# Altium footprint library Capacitance.PcbLib: 176 footprints (part 9 of 11)
Each footprint in its own frame and in the unit in brackets; x right, y up, seen from the top. Pads: shape width x height; smd on the part's side, far side on the other; paste and mask are expansions set on the pad; w line width, h text height; cw(c..) or ccw(c..) is an arc to the next point about the centre after c.
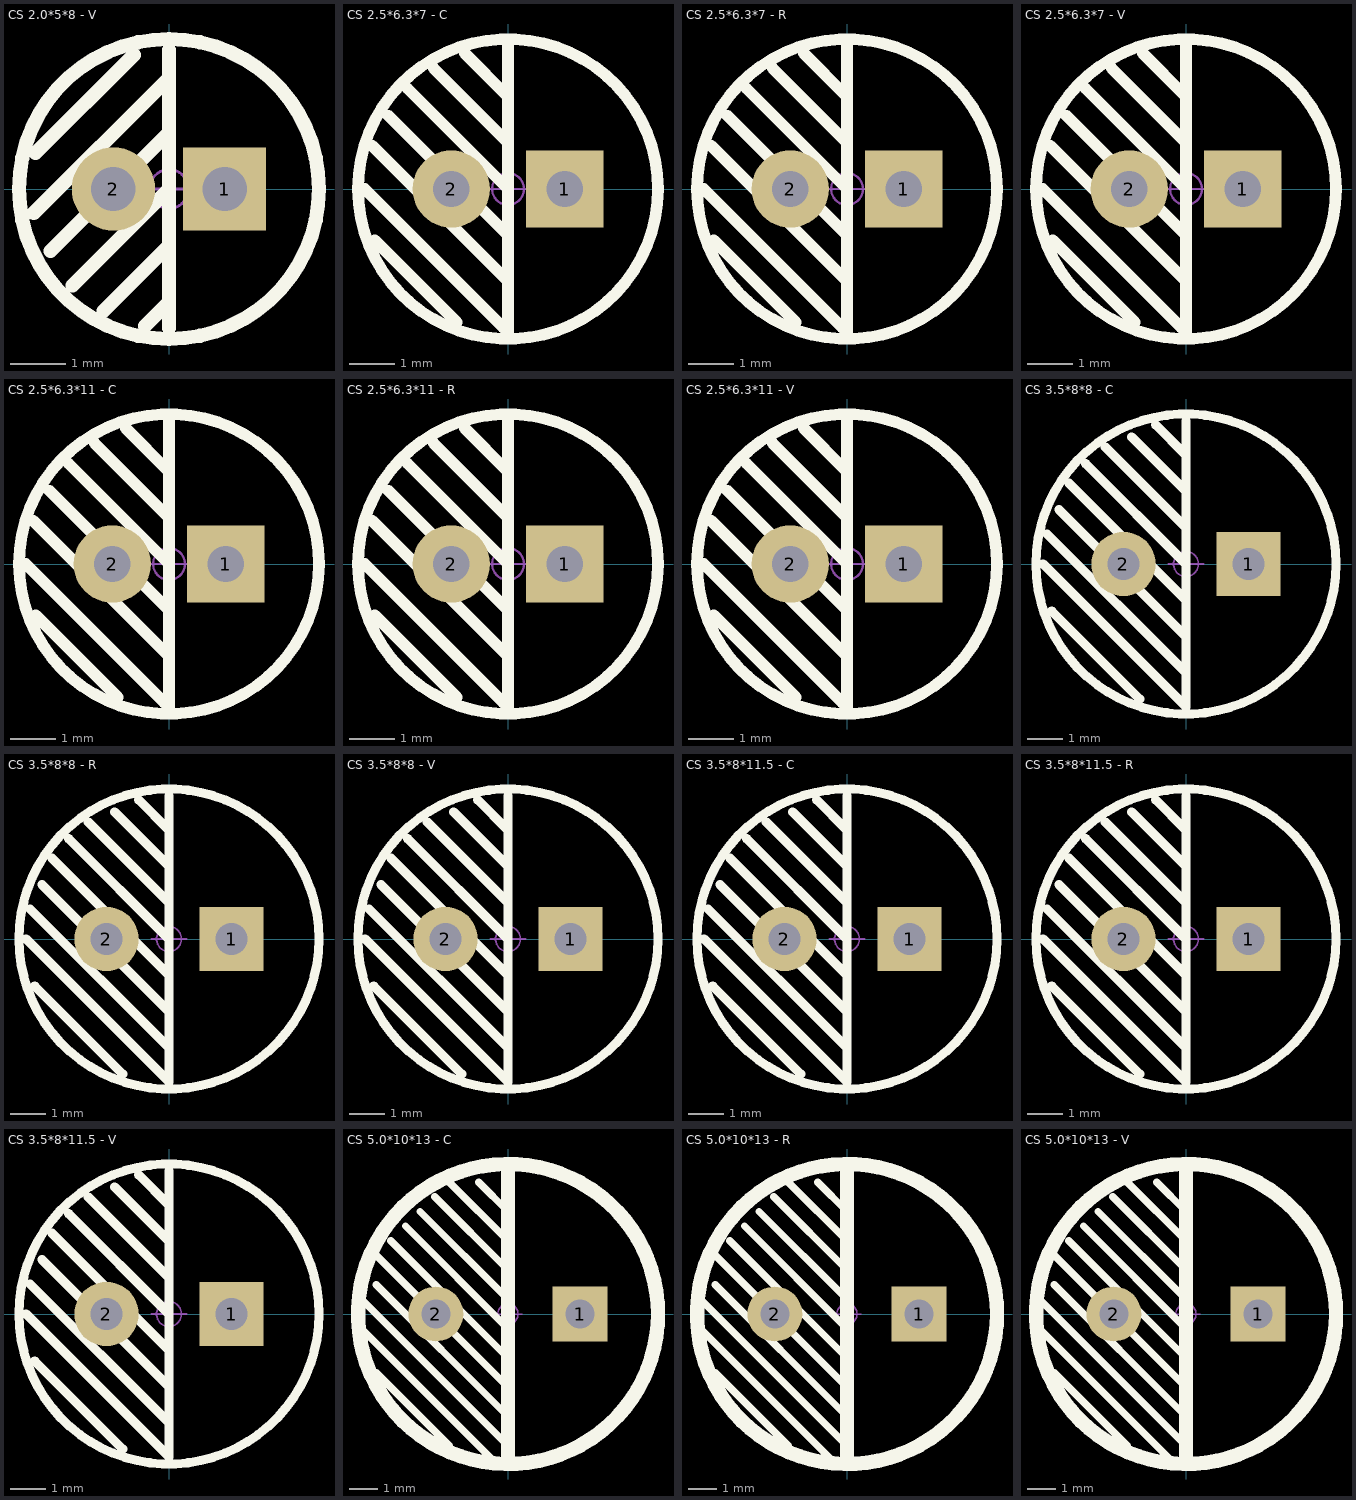
[diagram p8: the footprints below, top view; thin cyan lines are the x and y axes]

## CS 2.0*5*8 - V [mm] "ï¿½Å¾ï¿½2mm , Ö±ï¿½ï¿½5mm , ï¿½ï¿½8mm"
pads (2):
  rect 1.5x1.5 hole 0.8: 1(1,0)
  round 1.5 hole 0.8: 2(-1,0)
Top Overlay:
  circle w0.254: c0,0 r2.7
  lines w0.254: -2.435,-0.435 0,2 ; -2.4,0.648 -0.635,2.413 ; -2.134,-1.118 0,1.016 ; -1.74,-1.74 0,0 ; -1.181,-2.197 0,-1.016 ; -0.432,-2.464 0,-2.032 ; 0,-2.5 0,2 ; 0,2.5 0,2
Mechanical 15:
  circle w0.05: c0,0 r0.35
  lines w0.05: -0.5,0 0.5,0 ; 0,-0.5 0,0.5
3D body "CS 5X8.STEP": height 8.02, standoff -3.48, extent -2.5,-2.5 2.5,2.5

## CS 2.5*6.3*7 - C [mm] "ï¿½Å¾ï¿½2.5mm , Ö±ï¿½ï¿½6.3mm , ï¿½ï¿½7mm"
pads (2):
  rect 1.7x1.7 hole 0.8: 1(1.25,0)
  round 1.7 hole 0.8: 2(-1.25,0)
Top Overlay:
  circle w0.254: c0,0 r3.3
  lines w0.254: -3.15,0 -0.102,-3.048 0,-3.048 ; -2.984,0.953 0,-2.032 ; -2.934,-1.13 -1.13,-2.934 ; -2.629,1.613 0,-1.016 ; -2.21,2.21 0,0 ; -1.638,2.654 0,1.016 ; -0.953,2.984 0,2.032 ; 0,-3.15 0,3.15
Mechanical 15:
  circle w0.05: c0,0 r0.35
  lines w0.05: -0.5,0 0.5,0 ; 0,-0.5 0,0.5
3D body "CS 6.3X7.STEP": height 7.02, standoff -3.48, extent -3.15,-3.15 3.15,3.15

## CS 2.5*6.3*7 - R [mm] "ï¿½Å¾ï¿½2.5mm , Ö±ï¿½ï¿½6.3mm , ï¿½ï¿½7mm"
pads (2):
  rect 1.7x1.7 hole 0.8: 1(1.25,0)
  round 1.7 hole 0.8: 2(-1.25,0)
Top Overlay:
  circle w0.254: c0,0 r3.3
  lines w0.254: -3.15,0 -0.102,-3.048 0,-3.048 ; -2.984,0.953 0,-2.032 ; -2.934,-1.13 -1.13,-2.934 ; -2.629,1.613 0,-1.016 ; -2.21,2.21 0,0 ; -1.638,2.654 0,1.016 ; -0.953,2.984 0,2.032 ; 0,-3.15 0,3.15
Mechanical 15:
  circle w0.05: c0,0 r0.35
  lines w0.05: -0.5,0 0.5,0 ; 0,-0.5 0,0.5
3D body "CS 6.3X7.STEP": height 7.02, standoff -3.48, extent -3.15,-3.15 3.15,3.15

## CS 2.5*6.3*7 - V [mm] "ï¿½Å¾ï¿½2.5mm , Ö±ï¿½ï¿½6.3mm , ï¿½ï¿½7mm"
pads (2):
  rect 1.7x1.7 hole 0.8: 1(1.25,0)
  round 1.7 hole 0.8: 2(-1.25,0)
Top Overlay:
  circle w0.254: c0,0 r3.3
  lines w0.254: -3.15,0 -0.102,-3.048 0,-3.048 ; -2.984,0.953 0,-2.032 ; -2.934,-1.13 -1.13,-2.934 ; -2.629,1.613 0,-1.016 ; -2.21,2.21 0,0 ; -1.638,2.654 0,1.016 ; -0.953,2.984 0,2.032 ; 0,-3.15 0,3.15
Mechanical 15:
  circle w0.05: c0,0 r0.35
  lines w0.05: -0.5,0 0.5,0 ; 0,-0.5 0,0.5
3D body "CS 6.3X7.STEP": height 7, standoff -3.5, extent -3.15,-3.15 3.15,3.15

## CS 2.5*6.3*11 - C [mm] "ï¿½Å¾ï¿½2.5mm , Ö±ï¿½ï¿½6.3mm , ï¿½ï¿½11mm"
pads (2):
  rect 1.7x1.7 hole 0.8: 1(1.25,0)
  round 1.7 hole 0.8: 2(-1.25,0)
Top Overlay:
  circle w0.254: c0,0 r3.3
  lines w0.254: -3.15,0 -0.102,-3.048 0,-3.048 ; -2.984,0.953 0,-2.032 ; -2.934,-1.13 -1.13,-2.934 ; -2.629,1.613 0,-1.016 ; -2.21,2.21 0,0 ; -1.638,2.654 0,1.016 ; -0.953,2.984 0,2.032 ; 0,-3.15 0,3.15
Mechanical 15:
  circle w0.05: c0,0 r0.35
  lines w0.05: -0.5,0 0.5,0 ; 0,-0.5 0,0.5
3D body "CS 6.3X11.STEP": height 11.02, standoff -3.48, extent -3.15,-3.15 3.15,3.15

## CS 2.5*6.3*11 - R [mm] "ï¿½Å¾ï¿½2.5mm , Ö±ï¿½ï¿½6.3mm , ï¿½ï¿½11mm"
pads (2):
  rect 1.7x1.7 hole 0.8: 1(1.25,0)
  round 1.7 hole 0.8: 2(-1.25,0)
Top Overlay:
  circle w0.254: c0,0 r3.3
  lines w0.254: -3.15,0 -0.102,-3.048 0,-3.048 ; -2.984,0.953 0,-2.032 ; -2.934,-1.13 -1.13,-2.934 ; -2.629,1.613 0,-1.016 ; -2.21,2.21 0,0 ; -1.638,2.654 0,1.016 ; -0.953,2.984 0,2.032 ; 0,-3.15 0,3.15
Mechanical 15:
  circle w0.05: c0,0 r0.35
  lines w0.05: -0.5,0 0.5,0 ; 0,-0.5 0,0.5
3D body "CS 6.3X11.STEP": height 11.02, standoff -3.48, extent -3.15,-3.15 3.15,3.15

## CS 2.5*6.3*11 - V [mm] "ï¿½Å¾ï¿½2.5mm , Ö±ï¿½ï¿½6.3mm , ï¿½ï¿½11mm"
pads (2):
  rect 1.7x1.7 hole 0.8: 1(1.25,0)
  round 1.7 hole 0.8: 2(-1.25,0)
Top Overlay:
  circle w0.254: c0,0 r3.3
  lines w0.254: -3.15,0 -0.102,-3.048 0,-3.048 ; -2.984,0.953 0,-2.032 ; -2.934,-1.13 -1.13,-2.934 ; -2.629,1.613 0,-1.016 ; -2.21,2.21 0,0 ; -1.638,2.654 0,1.016 ; -0.953,2.984 0,2.032 ; 0,-3.15 0,3.15
Mechanical 15:
  circle w0.05: c0,0 r0.35
  lines w0.05: -0.5,0 0.5,0 ; 0,-0.5 0,0.5
3D body "CS 6.3X11.STEP": height 11.02, standoff -3.48, extent -3.15,-3.15 3.15,3.15

## CS 3.5*8*8 - C [mm] "ï¿½Å¾ï¿½3.5mm , Ö±ï¿½ï¿½8mm , ï¿½ï¿½8mm"
pads (2):
  rect 1.8x1.8 hole 0.9: 1(1.75,0)
  round 1.8 hole 0.9: 2(-1.75,0)
Top Overlay:
  circle w0.254: c0,0 r4.2
  lines w0.254: -4,0 0,-4 0,4 ; -3.886,0.838 0,-3.048 ; -3.759,-1.321 -1.295,-3.785 ; -3.556,1.524 0,-2.032 ; -3.277,2.261 0,-1.016 ; -2.807,2.807 0,0 ; -2.261,3.277 0,1.016 ; -1.524,3.556 0,2.032 ; -0.851,3.899 0,3.048
Mechanical 15:
  circle w0.05: c0,0 r0.35
  lines w0.05: -0.5,0 0.5,0 ; 0,-0.5 0,0.5
3D body "CS 8X8.STEP": height 8.02, standoff -3.48, extent -4,-4 4,4

## CS 3.5*8*8 - R [mm] "ï¿½Å¾ï¿½3.5mm , Ö±ï¿½ï¿½8mm , ï¿½ï¿½8mm"
pads (2):
  rect 1.8x1.8 hole 0.9: 1(1.75,0)
  round 1.8 hole 0.9: 2(-1.75,0)
Top Overlay:
  circle w0.254: c0,0 r4.2
  lines w0.254: -4,0 0,-4 0,4 ; -3.886,0.838 0,-3.048 ; -3.759,-1.321 -1.295,-3.785 ; -3.556,1.524 0,-2.032 ; -3.277,2.261 0,-1.016 ; -2.807,2.807 0,0 ; -2.261,3.277 0,1.016 ; -1.524,3.556 0,2.032 ; -0.851,3.899 0,3.048
Mechanical 15:
  circle w0.05: c0,0 r0.35
  lines w0.05: -0.5,0 0.5,0 ; 0,-0.5 0,0.5
3D body "CS 8X8.STEP": height 8.02, standoff -3.48, extent -4,-4 4,4

## CS 3.5*8*8 - V [mm] "ï¿½Å¾ï¿½3.5mm , Ö±ï¿½ï¿½8mm , ï¿½ï¿½8mm"
pads (2):
  rect 1.8x1.8 hole 0.9: 1(1.75,0)
  round 1.8 hole 0.9: 2(-1.75,0)
Top Overlay:
  circle w0.254: c0,0 r4.2
  lines w0.254: -4,0 0,-4 0,4 ; -3.886,0.838 0,-3.048 ; -3.759,-1.321 -1.295,-3.785 ; -3.556,1.524 0,-2.032 ; -3.277,2.261 0,-1.016 ; -2.807,2.807 0,0 ; -2.261,3.277 0,1.016 ; -1.524,3.556 0,2.032 ; -0.851,3.899 0,3.048
Mechanical 15:
  circle w0.05: c0,0 r0.35
  lines w0.05: -0.5,0 0.5,0 ; 0,-0.5 0,0.5
3D body "CS 8X8.STEP": height 8.02, standoff -3.48, extent -4,-4 4,4

## CS 3.5*8*11.5 - C [mm] "ï¿½Å¾ï¿½3.5mm , Ö±ï¿½ï¿½8mm , ï¿½ï¿½11.5mm"
pads (2):
  rect 1.8x1.8 hole 0.9: 1(1.75,0)
  round 1.8 hole 0.9: 2(-1.75,0)
Top Overlay:
  circle w0.254: c0,0 r4.2
  lines w0.254: -4,0 0,-4 0,4 ; -3.886,0.838 0,-3.048 ; -3.759,-1.321 -1.295,-3.785 ; -3.556,1.524 0,-2.032 ; -3.277,2.261 0,-1.016 ; -2.807,2.807 0,0 ; -2.261,3.277 0,1.016 ; -1.524,3.556 0,2.032 ; -0.851,3.899 0,3.048
Mechanical 15:
  circle w0.05: c0,0 r0.35
  lines w0.05: -0.5,0 0.5,0 ; 0,-0.5 0,0.5
3D body "CS 8X11.5.STEP": height 11.52, standoff -3.48, extent -4,-4 4,4

## CS 3.5*8*11.5 - R [mm] "ï¿½Å¾ï¿½3.5mm , Ö±ï¿½ï¿½8mm , ï¿½ï¿½11.5mm"
pads (2):
  rect 1.8x1.8 hole 0.9: 1(1.75,0)
  round 1.8 hole 0.9: 2(-1.75,0)
Top Overlay:
  circle w0.254: c0,0 r4.2
  lines w0.254: -4,0 0,-4 0,4 ; -3.886,0.838 0,-3.048 ; -3.759,-1.321 -1.295,-3.785 ; -3.556,1.524 0,-2.032 ; -3.277,2.261 0,-1.016 ; -2.807,2.807 0,0 ; -2.261,3.277 0,1.016 ; -1.524,3.556 0,2.032 ; -0.851,3.899 0,3.048
Mechanical 15:
  circle w0.05: c0,0 r0.35
  lines w0.05: -0.5,0 0.5,0 ; 0,-0.5 0,0.5
3D body "CS 8X11.5.STEP": height 11.52, standoff -3.48, extent -4,-4 4,4

## CS 3.5*8*11.5 - V [mm] "ï¿½Å¾ï¿½3.5mm , Ö±ï¿½ï¿½8mm , ï¿½ï¿½11.5mm"
pads (2):
  rect 1.8x1.8 hole 0.9: 1(1.75,0)
  round 1.8 hole 0.9: 2(-1.75,0)
Top Overlay:
  circle w0.254: c0,0 r4.2
  lines w0.254: -4,0 0,-4 0,4 ; -3.886,0.838 0,-3.048 ; -3.759,-1.321 -1.295,-3.785 ; -3.556,1.524 0,-2.032 ; -3.277,2.261 0,-1.016 ; -2.807,2.807 0,0 ; -2.261,3.277 0,1.016 ; -1.524,3.556 0,2.032 ; -0.851,3.899 0,3.048
Mechanical 15:
  circle w0.05: c0,0 r0.35
  lines w0.05: -0.5,0 0.5,0 ; 0,-0.5 0,0.5
3D body "CS 8X11.5.STEP": height 11.52, standoff -3.48, extent -4,-4 4,4

## CS 5.0*10*13 - C [mm] "ï¿½Å¾ï¿½5mm , Ö±ï¿½ï¿½10mm , ï¿½ï¿½13mm"
pads (2):
  rect 1.9x1.9 hole 1: 1(2.5,0)
  round 1.9 hole 1: 2(-2.5,0)
Top Overlay:
  circle w0.5: c0,0 r5.2
  lines w0.254: -5.08,-0.508 -0.508,-5.08 ; -5.08,0.508 0,-4.572 ; -4.572,-2.032 -2.032,-4.572 ; -4.572,1.016 0,-3.556 ; -4.572,2.032 0,-2.54 ; -4.064,2.54 0,-1.524 ; -3.556,3.048 0,-0.508 ; -3.048,3.556 0,0.508 0,1.016 ; -2.54,4.064 0,1.524 ; -2.032,4.572 0,2.54 ; -1.016,4.572 0,3.556
  lines w0.5: 0,-5 0,5
Mechanical 15:
  circle w0.05: c0,0 r0.35
  lines w0.05: -0.5,0 0.5,0 ; 0,-0.5 0,0.5
3D body "CS 10X13.STEP": height 13.02, standoff -3.48, extent -5,-5 5,5

## CS 5.0*10*13 - R [mm] "ï¿½Å¾ï¿½5mm , Ö±ï¿½ï¿½10mm , ï¿½ï¿½13mm"
pads (2):
  rect 1.9x1.9 hole 1: 1(2.5,0)
  round 1.9 hole 1: 2(-2.5,0)
Top Overlay:
  circle w0.5: c0,0 r5.2
  lines w0.254: -5.08,-0.508 -0.508,-5.08 ; -5.08,0.508 0,-4.572 ; -4.572,-2.032 -2.032,-4.572 ; -4.572,1.016 0,-3.556 ; -4.572,2.032 0,-2.54 ; -4.064,2.54 0,-1.524 ; -3.556,3.048 0,-0.508 ; -3.048,3.556 0,0.508 0,1.016 ; -2.54,4.064 0,1.524 ; -2.032,4.572 0,2.54 ; -1.016,4.572 0,3.556
  lines w0.5: 0,-5 0,5
Mechanical 15:
  circle w0.05: c0,0 r0.35
  lines w0.05: -0.5,0 0.5,0 ; 0,-0.5 0,0.5
3D body "CS 10X13.STEP": height 13.02, standoff -3.48, extent -5,-5 5,5

## CS 5.0*10*13 - V [mm] "ï¿½Å¾ï¿½5mm , Ö±ï¿½ï¿½10mm , ï¿½ï¿½13mm"
pads (2):
  rect 1.9x1.9 hole 1: 1(2.5,0)
  round 1.9 hole 1: 2(-2.5,0)
Top Overlay:
  circle w0.5: c0,0 r5.2
  lines w0.254: -5.08,-0.508 -0.508,-5.08 ; -5.08,0.508 0,-4.572 ; -4.572,-2.032 -2.032,-4.572 ; -4.572,1.016 0,-3.556 ; -4.572,2.032 0,-2.54 ; -4.064,2.54 0,-1.524 ; -3.556,3.048 0,-0.508 ; -3.048,3.556 0,0.508 0,1.016 ; -2.54,4.064 0,1.524 ; -2.032,4.572 0,2.54 ; -1.016,4.572 0,3.556
  lines w0.5: 0,-5 0,5
Mechanical 15:
  circle w0.05: c0,0 r0.35
  lines w0.05: -0.5,0 0.5,0 ; 0,-0.5 0,0.5
3D body "CS 10X13.STEP": height 13.02, standoff -3.48, extent -5,-5 5,5